# Altium footprint library UltraZOhm_CarrierBoard.PcbLib: 123 footprints (part 7 of 8)
Each footprint in its own frame and in the unit in brackets; x right, y up, seen from the top. Pads: shape width x height; smd on the part's side, far side on the other; paste and mask are expansions set on the pad; w line width, h text height; cw(c..) or ccw(c..) is an arc to the next point about the centre after c.
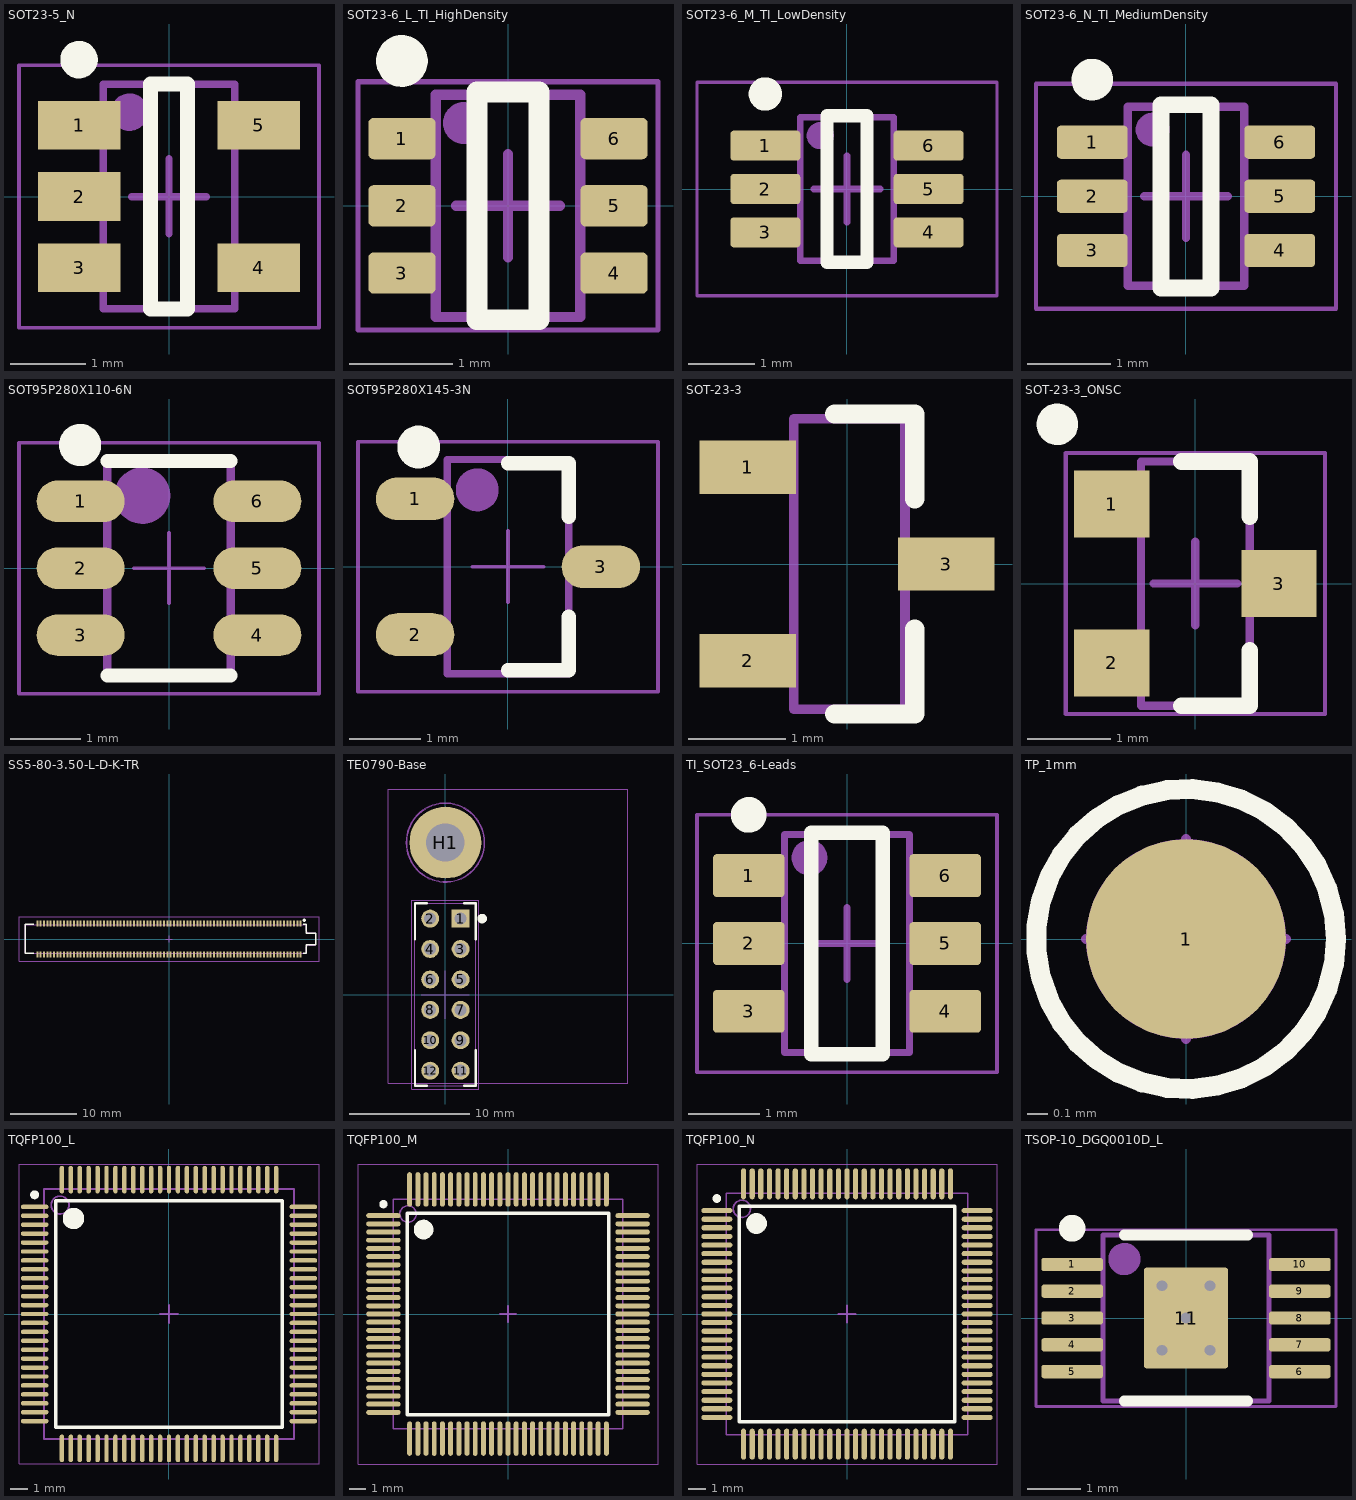
[diagram p6: the footprints below, top view; thin cyan lines are the x and y axes]

## SOT23-5_N [mm] "SOT23, 5-Leads, Body 2.9x1.6mm, Pitch 0.95mm, Lead Span 2.8mm, IPC Medium Density"
height 1.45
pads (5):
  rect 1.1x0.65 smd: 1(-1.2,0.95) 2(-1.2,0) 3(-1.2,-0.95) 4(1.2,-0.95) 5(1.2,0.95)
Top Overlay:
  circle w0.25: c-1.2,1.825 r0.125
  lines w0.2: -0.25,-1.5 0.25,-1.5 0.25,1.5 -0.25,1.5 -0.25,-1.5
M5 Assembly Top:
  circle w0.25: c-0.525,1.125 r0.125
  lines w0.05: -0.85,-1.15 -1.5,-1.15 -1.5,-0.75 -0.85,-0.75 ; -0.85,-0.2 -1.5,-0.2 -1.5,0.2 -0.85,0.2 ; -0.85,0.75 -1.5,0.75 -1.5,1.15 -0.85,1.15 ; 0.85,-1.15 1.5,-1.15 1.5,-0.75 0.85,-0.75 ; 0.85,0.75 1.5,0.75 1.5,1.15 0.85,1.15
  lines w0.1: -0.875,-1.5 -0.875,1.5 0.875,1.5 0.875,-1.5 -0.875,-1.5
  text ".Designator" at 0.4,-1.324 h0.76
Mechanical 15:
  lines w0.05: -2,-1.75 -2,1.75 2,1.75 2,-1.75 -2,-1.75
  lines w0.1: -0.5,0 0.5,0 ; 0,-0.5 0,0.5
3D body: height 1.45, standoff 0, extent -0.875,-1.5 0.875,1.5

## SOT23-6_L_TI_HighDensity [mm] "SOT23, 6-Leads, Body 2.15x1.4mm, Pitch 0.65mm, IPC High Density"
height 1.1
pads (6):
  rrect25% 0.65x0.4 smd: 1(-1.025,0.65) 2(-1.025,0) 3(-1.025,-0.65) 4(1.025,-0.65) 5(1.025,0) 6(1.025,0.65)
Top Overlay:
  circle w0.25: c-1.025,1.4 r0.125
  lines w0.2: -0.3,-1.1 0.3,-1.1 0.3,1.1 -0.3,1.1 -0.3,-1.1
M5 Assembly Top:
  circle w0.203: c-0.425,0.8 r0.102
  lines w0.1: -0.7,-1.075 -0.7,1.075 0.7,1.075 0.7,-1.075 -0.7,-1.075
  text ".Designator" at 0.4,-0.824 h0.76
Mechanical 15:
  lines w0.05: -1.45,-1.2 -1.45,1.2 1.45,1.2 1.45,-1.2 -1.45,-1.2
  lines w0.1: -0.5,0 0.5,0 ; 0,-0.5 0,0.5
3D body "DCK0006AakaMAA06.stp": height 0.94, standoff -0.01, extent -1.14,-1 1.14,1

## SOT23-6_M_TI_LowDensity [mm] "SOT23, 6-Leads, Body 2.15x1.4mm, Pitch 0.65mm, IPC Low Density"
height 1.1
pads (6):
  rrect22% 1.05x0.45 smd: 1(-1.225,0.65) 2(-1.225,0) 3(-1.225,-0.65) 4(1.225,-0.65) 5(1.225,0) 6(1.225,0.65)
Top Overlay:
  circle w0.25: c-1.225,1.425 r0.125
  lines w0.2: -0.3,-1.1 -0.3,1.1 0.3,1.1 0.3,-1.1 -0.3,-1.1
M5 Assembly Top:
  circle w0.203: c-0.402,0.8 r0.102
  lines w0.1: -0.7,-1.075 0.7,-1.075 0.7,1.075 -0.7,1.075 -0.7,-1.075
  text ".Designator" at 0.4,-0.924 h0.76
Mechanical 15:
  lines w0.05: -2.25,-1.6 2.25,-1.6 2.25,1.6 -2.25,1.6 -2.25,-1.6
  lines w0.1: -0.5,0 0.5,0 ; 0,-0.5 0,0.5
3D body "DCK0006AakaMAA06.stp": height 0.94, standoff -0.01, extent -1.14,-1 1.14,1

## SOT23-6_N_TI_MediumDensity [mm] "SOT23, 6-Leads, Body 2.15x1.4mm, Pitch 0.65mm, IPC Medium Density"
height 1.1
pads (6):
  rrect25% 0.85x0.4 smd: 1(-1.125,0.65) 2(-1.125,0) 3(-1.125,-0.65) 4(1.125,-0.65) 5(1.125,0) 6(1.125,0.65)
Top Overlay:
  circle w0.25: c-1.125,1.4 r0.125
  lines w0.2: -0.3,-1.1 0.3,-1.1 0.3,1.1 -0.3,1.1 -0.3,-1.1
M5 Assembly Top:
  circle w0.203: c-0.402,0.8 r0.102
  lines w0.1: -0.7,-1.075 -0.7,1.075 0.7,1.075 0.7,-1.075 -0.7,-1.075
  text ".Designator" at 0.4,-0.924 h0.76
Mechanical 15:
  lines w0.05: -1.8,-1.35 -1.8,1.35 1.8,1.35 1.8,-1.35 -1.8,-1.35
  lines w0.1: -0.5,0 0.5,0 ; 0,-0.5 0,0.5
3D body "DCK0006AakaMAA06.stp": height 0.94, standoff -0.01, extent -1.14,-1 1.14,1

## SOT95P280X110-6N [mm]
height 1.1
pads (6):
  oval 1.25x0.59 smd: 1(-1.255,0.95) 2(-1.255,0) 3(-1.255,-0.95) 4(1.255,-0.95) 5(1.255,0) 6(1.255,0.95)
Top Overlay:
  circle w0.3: c-1.262,1.75 r0.15
  lines w0.2: -0.875,-1.525 0.874,-1.525 ; -0.874,1.525 0.875,1.525
M5 Assembly Top:
  circle w0.4: c-0.38,1.03 r0.2
  lines w0.12: -0.88,-1.53 0.88,-1.53 0.88,1.53 -0.88,1.53 -0.88,-1.53
  text ".Designator" at 0.5,-1.324 h0.76
Mechanical 15:
  lines w0.05: -0.5,0 0.5,0 ; 0,-0.5 0,0.5 ; -2.13,-1.78 2.13,-1.78 2.13,1.78 -2.13,1.78 -2.13,-1.78
3D body "User Library-TSOT-23-6(S6).STEP": height 1, standoff 0, extent -1.412,-1.45 1.412,1.45

## SOT95P280X145-3N [mm] "SOT23, 3-Leads, Body 3,0x3,0mm (max), Pitch 0,95mm, IPC Medium Density"
height 1.45
pads (3):
  oval 1.1x0.6 smd: 1(-1.3,0.95) 2(-1.3,-0.95) 3(1.3,0)
Top Overlay:
  circle w0.3: c-1.25,1.675 r0.15
  lines w0.2: 0,-1.45 0.85,-1.45 0.85,-0.7 ; 0,1.45 0.85,1.45 0.85,0.7
M5 Assembly Top:
  circle w0.3: c-0.43,1.075 r0.15
  lines w0.05: -0.85,-1.15 -1.675,-1.15 -1.675,-0.75 -0.85,-0.75 ; -0.85,0.75 -1.675,0.75 -1.675,1.15 -0.85,1.15 ; 0.85,-0.2 1.675,-0.2 1.675,0.2 0.85,0.2
  lines w0.1: -0.85,-1.5 -0.85,1.5 0.85,1.5 0.85,-1.5 -0.85,-1.5
  text ".Designator" at 0.4,-1.224 h0.76
Mechanical 15:
  lines w0.05: -0.5,0 0.5,0 ; 0,-0.5 0,0.5 ; -2.1,-1.75 -2.1,1.75 2.1,1.75 2.1,-1.75 -2.1,-1.75
3D body "SW3dPS-3-lead sot23-3.STEP": height 1.01, standoff -0.01, extent -1.25,-1.46 1.226,1.46

## SOT-23-3 [mm] "3-pin SOT-23"
height 1.1
pads (3):
  rect 1x0.55 smd: 1(-1.025,1) 2(-1.025,-1) 3(1.025,0)
Top Overlay:
  lines w0.2: -0.125,-1.55 0.7,-1.55 0.7,-0.675 ; -0.125,1.55 0.7,1.55 0.7,0.675
M5 Assembly Top:
  lines w0.05: -0.55,-1.2 -1.375,-1.2 -1.375,-0.8 -0.55,-0.8 ; -0.55,0.8 -1.375,0.8 -1.375,1.2 -0.55,1.2 ; 0.6,-0.2 1.375,-0.2 1.375,0.2 0.6,0.2
  lines w0.1: -0.55,-1.5 0.6,-1.5 0.6,1.5 -0.55,1.5 -0.55,-1.5
  text ".Designator" at 0.4,-1.224 h0.76
3D body "User Library-SOT-23-3-1.STEP": height 1.1, standoff 0, extent -1.247,-1.5 1.295,1.5

## SOT-23-3_ONSC [mm] "SOT23, 3-Leads, Body 2.92x1.3mm, Pitch 0.95mm"
height 1.11
pads (3):
  rect 0.9x0.8 smd: 1(-1,0.95) 2(-1,-0.95) 3(1,0)
Top Overlay:
  circle w0.25: c-1.651,1.905 r0.123
  lines w0.2: -0.165,-1.46 0.65,-1.46 0.65,-0.8 ; -0.165,1.46 0.65,1.46 0.65,0.8
M5 Assembly Top:
  lines w0.05: -0.65,-1.2 -1.3,-1.2 -1.3,-0.8 -0.65,-0.8 ; -0.65,0.8 -1.3,0.8 -1.3,1.2 -0.65,1.2 ; 0.65,-0.2 1.3,-0.2 1.3,0.2 0.65,0.2
  lines w0.1: -0.65,-1.46 0.65,-1.46 0.65,1.46 -0.65,1.46 -0.65,-1.46
  text ".Designator" at 0.4,-1.224 h0.76
Mechanical 15:
  lines w0.05: -1.55,-1.56 1.55,-1.56 1.55,1.56 -1.55,1.56 -1.55,-1.56
  lines w0.1: -0.5,0 0.5,0 ; 0,-0.5 0,0.5
3D body: height 1.11, standoff 0.01, extent -0.65,-1.46 0.65,1.46

## SS5-80-3.50-L-D-K-TR [mm]
height 3.5
pads (160):
  rrect20% 0.3x0.93 smd mask+0.05: 1(19.75,2.335) 2(19.75,-2.335) 3(19.25,2.335) 4(19.25,-2.335) 5(18.75,2.335) 6(18.75,-2.335) 7(18.25,2.335) 8(18.25,-2.335) 9(17.75,2.335) 10(17.75,-2.335) 11(17.25,2.335) 12(17.25,-2.335) 13(16.75,2.335) 14(16.75,-2.335) 15(16.25,2.335) 16(16.25,-2.335) 17(15.75,2.335) 18(15.75,-2.335) 19(15.25,2.335) 20(15.25,-2.335) 21(14.75,2.335) 22(14.75,-2.335) 23(14.25,2.335) 24(14.25,-2.335) 25(13.75,2.335) 26(13.75,-2.335) 27(13.25,2.335) 28(13.25,-2.335) 29(12.75,2.335) 30(12.75,-2.335) 31(12.25,2.335) 32(12.25,-2.335) 33(11.75,2.335) 34(11.75,-2.335) 35(11.25,2.335) 36(11.25,-2.335) 37(10.75,2.335) 38(10.75,-2.335) 39(10.25,2.335) 40(10.25,-2.335) 41(9.75,2.335) 42(9.75,-2.335) 43(9.25,2.335) 44(9.25,-2.335) 45(8.75,2.335) 46(8.75,-2.335) 47(8.25,2.335) 48(8.25,-2.335) 49(7.75,2.335) 50(7.75,-2.335) 51(7.25,2.335) 52(7.25,-2.335) 53(6.75,2.335) 54(6.75,-2.335) 55(6.25,2.335) 56(6.25,-2.335) 57(5.75,2.335) 58(5.75,-2.335) 59(5.25,2.335) 60(5.25,-2.335) 61(4.75,2.335) 62(4.75,-2.335) 63(4.25,2.335) 64(4.25,-2.335) 65(3.75,2.335) 66(3.75,-2.335) 67(3.25,2.335) 68(3.25,-2.335) 69(2.75,2.335) 70(2.75,-2.335) 71(2.25,2.335) 72(2.25,-2.335) 73(1.75,2.335) 74(1.75,-2.335) 75(1.25,2.335) 76(1.25,-2.335) 77(0.75,2.335) 78(0.75,-2.335) 79(0.25,2.335) 80(0.25,-2.335) 81(-0.25,2.335) 82(-0.25,-2.335) 83(-0.75,2.335) 84(-0.75,-2.335) 85(-1.25,2.335) 86(-1.25,-2.335) 87(-1.75,2.335) 88(-1.75,-2.335) 89(-2.25,2.335) 90(-2.25,-2.335) 91(-2.75,2.335) 92(-2.75,-2.335) 93(-3.25,2.335) 94(-3.25,-2.335) 95(-3.75,2.335) 96(-3.75,-2.335) 97(-4.25,2.335) 98(-4.25,-2.335) 99(-4.75,2.335) 100(-4.75,-2.335) 101(-5.25,2.335) 102(-5.25,-2.335) 103(-5.75,2.335) 104(-5.75,-2.335) 105(-6.25,2.335) 106(-6.25,-2.335) 107(-6.75,2.335) 108(-6.75,-2.335) 109(-7.25,2.335) 110(-7.25,-2.335) 111(-7.75,2.335) 112(-7.75,-2.335) 113(-8.25,2.335) 114(-8.25,-2.335) 115(-8.75,2.335) 116(-8.75,-2.335) 117(-9.25,2.335) 118(-9.25,-2.335) 119(-9.75,2.335) 120(-9.75,-2.335) 121(-10.25,2.335) 122(-10.25,-2.335) 123(-10.75,2.335) 124(-10.75,-2.335) 125(-11.25,2.335) 126(-11.25,-2.335) 127(-11.75,2.335) 128(-11.75,-2.335) 129(-12.25,2.335) 130(-12.25,-2.335) 131(-12.75,2.335) 132(-12.75,-2.335) 133(-13.25,2.335) 134(-13.25,-2.335) 135(-13.75,2.335) 136(-13.75,-2.335) 137(-14.25,2.335) 138(-14.25,-2.335) 139(-14.75,2.335) 140(-14.75,-2.335) 141(-15.25,2.335) 142(-15.25,-2.335) 143(-15.75,2.335) 144(-15.75,-2.335) 145(-16.25,2.335) 146(-16.25,-2.335) 147(-16.75,2.335) 148(-16.75,-2.335) 149(-17.25,2.335) 150(-17.25,-2.335) 151(-17.75,2.335) 152(-17.75,-2.335) 153(-18.25,2.335) 154(-18.25,-2.335) 155(-18.75,2.335) 156(-18.75,-2.335) 157(-19.25,2.335) 158(-19.25,-2.335) 159(-19.75,2.335) 160(-19.75,-2.335)
Top Overlay:
  circle w0.25: c20.3,2.81 r0.125
  lines w0.2: -20.3,-2.175 -21.571,-2.175 -21.571,2.175 -20.3,2.175 ; 20.15,-2.175 20.58,-2.175 20.58,-0.9 21.98,-0.9 21.98,0.9 20.58,0.9 20.58,2.175 20.15,2.175
M5 Assembly Top:
  lines w0.1: -21.56,-2.175 -21.56,2.175 20.58,2.175 20.58,1.3 ccw(c20.98,1.3) 20.98,0.9 21.83,0.9 cw(c21.83,0.75) 21.98,0.75 21.98,-0.75 cw(c21.83,-0.75) 21.83,-0.9 20.98,-0.9 ccw(c20.98,-1.3) 20.58,-1.3 20.58,-2.175 -21.56,-2.175
  text "160" at -21.105,-1.853 h0.6
  text "159" at -21.105,0.772 h0.6
  text "2" at 19.595,-1.878 h0.6
  text "1" at 19.745,0.847 h0.6
  text ".Designator" at -2.005,-0.503 h1.52
Mechanical 15:
  lines w0.05: -0.5,0 0.5,0 ; 0,-0.5 0,0.5 ; -22.5,-3.3 -22.5,3.3 22.5,3.3 22.5,-3.3 -22.5,-3.3
3D body "SS5-80-3.50-D-K-TR.stp": height 4.03, standoff 0.03, extent -21.56,-2.5 21.98,2.5

## TE0790-Base [mm]
height 15
pads (13):
  rect 1.5x1.5 hole 1: 1(1.27,6.35)
  round 1.5 hole 1: 2(-1.27,6.35) 3(1.27,3.81) 4(-1.27,3.81) 5(1.27,1.27) 6(-1.27,1.27) 7(1.27,-1.27) 8(-1.27,-1.27) 9(1.27,-3.81) 10(-1.27,-3.81) 11(1.27,-6.35) 12(-1.27,-6.35)
  round 6 hole 3.2: H1(0,12.7)
Top Overlay:
  circle w0.4: c3.07,6.35 r0.2
  lines w0.2: -2.54,-4.62 -2.54,-7.62 -1.56,-7.62 ; -2.54,4.62 -2.54,7.62 -1.56,7.62 ; 1.56,-7.62 2.54,-7.62 2.54,-4.62 ; 1.56,7.62 2.54,7.62 2.54,4.62
M5 Assembly Top:
  circle w0.1: c0,12.7 r1.6
  circle w0.1: c0,12.7 r3.25
  lines w0.1: -2.54,-7.62 2.54,-7.62 2.54,7.62 -2.54,7.62 -2.54,-7.62
  text "11" at 1,-5.23 h1
  text "12" at -2,-5.23 h1
  text "2" at -2,6.73 h1
  text "1" at 1,6.73 h1
  text ".Designator" at -4.75,-2.35 h1.52
Mechanical 11:
  lines w0.1: -4.78,-7.38 15.24,-7.38 15.24,17.174 -4.78,17.174 -4.78,-7.38
Mechanical 14:
  circle w0.1: c0,12.7 r3.25
  circle w0.1: c0,12.7 r1.6
Mechanical 15:
  circle w0.05: c0,12.7 r3.3
  lines w0.05: -2,0 2,0 ; -1,12.7 1,12.7 ; 0,-2 0,2 ; 0,11.7 0,13.7 ; -2.8,-7.88 2.8,-7.88 2.8,7.88 -2.8,7.88 -2.8,-7.88
Mechanical 16:
  circle w0.05: c0,12.7 r3.3
3D body "female_header_a-bl254-dg-g12d.stp": height 8.5, standoff -3.2, extent -2.5,-7.745 2.5,7.745
3D body "TE0790-01.step": height 14.23, standoff 2.57, extent -4.78,-7.62 15.24,18.697

## TI_SOT23_6-Leads [mm] "SOT23, 6-Leads, Body 3.05x1.75mm, Pitch 0.95mm, IPC Medium Density"
height 1.45
pads (6):
  rrect17% 1x0.6 smd: 1(-1.375,0.95) 2(-1.375,0) 3(-1.375,-0.95) 4(1.375,-0.95) 5(1.375,0) 6(1.375,0.95)
Top Overlay:
  circle w0.25: c-1.375,1.8 r0.125
  lines w0.2: -0.5,-1.55 0.5,-1.55 0.5,1.55 -0.5,1.55 -0.5,-1.55
M5 Assembly Top:
  circle w0.25: c-0.525,1.2 r0.125
  lines w0.1: -0.875,-1.525 -0.875,1.525 0.875,1.525 0.875,-1.525 -0.875,-1.525
  text ".Designator" at 0.4,-1.324 h0.76
Mechanical 15:
  lines w0.05: -2.1,-1.8 -2.1,1.8 2.1,1.8 2.1,-1.8 -2.1,-1.8
  lines w0.1: -0.5,0 0.5,0 ; 0,-0.5 0,0.5
3D body "DBV0006AakaMF06A.stp": height 1.11, standoff -0.01, extent -1.422,-1.461 1.422,1.46

## TP_1mm [mm]
pads (1):
  round 1 smd paste-1: 1(0,0)
Top Overlay:
  circle w0.1: c0,0 r0.75
M5 Assembly Top:
  circle w0.6: c0,0 r0.2
Mechanical 15:
  circle w0.05: c0,0 r0.75
  lines w0.05: -0.5,0 0.5,0 ; 0,-0.5 0,0.5

## TQFP100_L [mm] "Thin QFP, 100-Leads, Body 14x14mm, Pitch 0.5mm, IPC High Density"
height 1.6
pads (100):
  oval 1.55x0.25 smd: 1(-7.525,6) 2(-7.525,5.5) 3(-7.525,5) 4(-7.525,4.5) 5(-7.525,4) 6(-7.525,3.5) 7(-7.525,3) 8(-7.525,2.5) 9(-7.525,2) 10(-7.525,1.5) 11(-7.525,1) 12(-7.525,0.5) 13(-7.525,0) 14(-7.525,-0.5) 15(-7.525,-1) 16(-7.525,-1.5) 17(-7.525,-2) 18(-7.525,-2.5) 19(-7.525,-3) 20(-7.525,-3.5) 21(-7.525,-4) 22(-7.525,-4.5) 23(-7.525,-5) 24(-7.525,-5.5) 25(-7.525,-6) 51(7.525,-6) 52(7.525,-5.5) 53(7.525,-5) 54(7.525,-4.5) 55(7.525,-4) 56(7.525,-3.5) 57(7.525,-3) 58(7.525,-2.5) 59(7.525,-2) 60(7.525,-1.5) 61(7.525,-1) 62(7.525,-0.5) 63(7.525,0) 64(7.525,0.5) 65(7.525,1) 66(7.525,1.5) 67(7.525,2) 68(7.525,2.5) 69(7.525,3) 70(7.525,3.5) 71(7.525,4) 72(7.525,4.5) 73(7.525,5) 74(7.525,5.5) 75(7.525,6)
  oval 0.25x1.55 smd: 26(-6,-7.525) 27(-5.5,-7.525) 28(-5,-7.525) 29(-4.5,-7.525) 30(-4,-7.525) 31(-3.5,-7.525) 32(-3,-7.525) 33(-2.5,-7.525) 34(-2,-7.525) 35(-1.5,-7.525) 36(-1,-7.525) 37(-0.5,-7.525) 38(0,-7.525) 39(0.5,-7.525) 40(1,-7.525) 41(1.5,-7.525) 42(2,-7.525) 43(2.5,-7.525) 44(3,-7.525) 45(3.5,-7.525) 46(4,-7.525) 47(4.5,-7.525) 48(5,-7.525) 49(5.5,-7.525) 50(6,-7.525) 76(6,7.525) 77(5.5,7.525) 78(5,7.525) 79(4.5,7.525) 80(4,7.525) 81(3.5,7.525) 82(3,7.525) 83(2.5,7.525) 84(2,7.525) 85(1.5,7.525) 86(1,7.525) 87(0.5,7.525) 88(0,7.525) 89(-0.5,7.525) 90(-1,7.525) 91(-1.5,7.525) 92(-2,7.525) 93(-2.5,7.525) 94(-3,7.525) 95(-3.5,7.525) 96(-4,7.525) 97(-4.5,7.525) 98(-5,7.525) 99(-5.5,7.525) 100(-6,7.525)
Top Overlay:
  circle w0.6: c-5.35,5.35 r0.3
  circle w0.25: c-7.525,6.675 r0.125
  lines w0.2: -6.35,-6.35 6.35,-6.35 6.35,6.35 -6.35,6.35 -6.35,-6.35
M5 Assembly Top:
  circle w0.1: c-6.1,6.1 r0.5
  lines w0.1: -7,-7 7,-7 7,7 -7,7 -7,-7
  text ".Designator" at -1.724,-0.8 h1.52
Mechanical 15:
  lines w0.05: -8.4,-8.4 8.4,-8.4 8.4,8.4 -8.4,8.4 -8.4,-8.4
  lines w0.1: -0.5,0 0.5,0 ; 0,-0.5 0,0.5
3D body: height 1.6, standoff 0, extent -7,-7 7,7

## TQFP100_M [mm] "Thin QFP, 100-Leads, Body 14x14mm, Pitch 0.5mm, IPC Low Density"
height 1.6
pads (100):
  oval 2.1x0.3 smd: 1(-7.6,6) 2(-7.6,5.5) 3(-7.6,5) 4(-7.6,4.5) 5(-7.6,4) 6(-7.6,3.5) 7(-7.6,3) 8(-7.6,2.5) 9(-7.6,2) 10(-7.6,1.5) 11(-7.6,1) 12(-7.6,0.5) 13(-7.6,0) 14(-7.6,-0.5) 15(-7.6,-1) 16(-7.6,-1.5) 17(-7.6,-2) 18(-7.6,-2.5) 19(-7.6,-3) 20(-7.6,-3.5) 21(-7.6,-4) 22(-7.6,-4.5) 23(-7.6,-5) 24(-7.6,-5.5) 25(-7.6,-6) 51(7.6,-6) 52(7.6,-5.5) 53(7.6,-5) 54(7.6,-4.5) 55(7.6,-4) 56(7.6,-3.5) 57(7.6,-3) 58(7.6,-2.5) 59(7.6,-2) 60(7.6,-1.5) 61(7.6,-1) 62(7.6,-0.5) 63(7.6,0) 64(7.6,0.5) 65(7.6,1) 66(7.6,1.5) 67(7.6,2) 68(7.6,2.5) 69(7.6,3) 70(7.6,3.5) 71(7.6,4) 72(7.6,4.5) 73(7.6,5) 74(7.6,5.5) 75(7.6,6)
  oval 0.3x2.1 smd: 26(-6,-7.6) 27(-5.5,-7.6) 28(-5,-7.6) 29(-4.5,-7.6) 30(-4,-7.6) 31(-3.5,-7.6) 32(-3,-7.6) 33(-2.5,-7.6) 34(-2,-7.6) 35(-1.5,-7.6) 36(-1,-7.6) 37(-0.5,-7.6) 38(0,-7.6) 39(0.5,-7.6) 40(1,-7.6) 41(1.5,-7.6) 42(2,-7.6) 43(2.5,-7.6) 44(3,-7.6) 45(3.5,-7.6) 46(4,-7.6) 47(4.5,-7.6) 48(5,-7.6) 49(5.5,-7.6) 50(6,-7.6) 76(6,7.6) 77(5.5,7.6) 78(5,7.6) 79(4.5,7.6) 80(4,7.6) 81(3.5,7.6) 82(3,7.6) 83(2.5,7.6) 84(2,7.6) 85(1.5,7.6) 86(1,7.6) 87(0.5,7.6) 88(0,7.6) 89(-0.5,7.6) 90(-1,7.6) 91(-1.5,7.6) 92(-2,7.6) 93(-2.5,7.6) 94(-3,7.6) 95(-3.5,7.6) 96(-4,7.6) 97(-4.5,7.6) 98(-5,7.6) 99(-5.5,7.6) 100(-6,7.6)
Top Overlay:
  circle w0.25: c-7.6,6.7 r0.125
  circle w0.6: c-5.15,5.15 r0.3
  lines w0.2: -6.15,-6.15 -6.15,6.15 6.15,6.15 6.15,-6.15 -6.15,-6.15
M5 Assembly Top:
  circle w0.1: c-6.1,6.1 r0.5
  lines w0.1: -7,-7 -7,7 7,7 7,-7 -7,-7
  text ".Designator" at -1.824,-0.8 h1.52
Mechanical 15:
  lines w0.05: -9.15,-9.15 -9.15,9.15 9.15,9.15 9.15,-9.15 -9.15,-9.15
  lines w0.1: -0.5,0 0.5,0 ; 0,-0.5 0,0.5
3D body: height 1.6, standoff 0, extent -7,-7 7,7

## TQFP100_N [mm] "Thin QFP, 100-Leads, Body 14x14mm, Pitch 0.5mm, IPC Medium Density"
height 1.6
pads (100):
  oval 1.8x0.3 smd: 1(-7.55,6) 2(-7.55,5.5) 3(-7.55,5) 4(-7.55,4.5) 5(-7.55,4) 6(-7.55,3.5) 7(-7.55,3) 8(-7.55,2.5) 9(-7.55,2) 10(-7.55,1.5) 11(-7.55,1) 12(-7.55,0.5) 13(-7.55,0) 14(-7.55,-0.5) 15(-7.55,-1) 16(-7.55,-1.5) 17(-7.55,-2) 18(-7.55,-2.5) 19(-7.55,-3) 20(-7.55,-3.5) 21(-7.55,-4) 22(-7.55,-4.5) 23(-7.55,-5) 24(-7.55,-5.5) 25(-7.55,-6) 51(7.55,-6) 52(7.55,-5.5) 53(7.55,-5) 54(7.55,-4.5) 55(7.55,-4) 56(7.55,-3.5) 57(7.55,-3) 58(7.55,-2.5) 59(7.55,-2) 60(7.55,-1.5) 61(7.55,-1) 62(7.55,-0.5) 63(7.55,0) 64(7.55,0.5) 65(7.55,1) 66(7.55,1.5) 67(7.55,2) 68(7.55,2.5) 69(7.55,3) 70(7.55,3.5) 71(7.55,4) 72(7.55,4.5) 73(7.55,5) 74(7.55,5.5) 75(7.55,6)
  oval 0.3x1.8 smd: 26(-6,-7.55) 27(-5.5,-7.55) 28(-5,-7.55) 29(-4.5,-7.55) 30(-4,-7.55) 31(-3.5,-7.55) 32(-3,-7.55) 33(-2.5,-7.55) 34(-2,-7.55) 35(-1.5,-7.55) 36(-1,-7.55) 37(-0.5,-7.55) 38(0,-7.55) 39(0.5,-7.55) 40(1,-7.55) 41(1.5,-7.55) 42(2,-7.55) 43(2.5,-7.55) 44(3,-7.55) 45(3.5,-7.55) 46(4,-7.55) 47(4.5,-7.55) 48(5,-7.55) 49(5.5,-7.55) 50(6,-7.55) 76(6,7.55) 77(5.5,7.55) 78(5,7.55) 79(4.5,7.55) 80(4,7.55) 81(3.5,7.55) 82(3,7.55) 83(2.5,7.55) 84(2,7.55) 85(1.5,7.55) 86(1,7.55) 87(0.5,7.55) 88(0,7.55) 89(-0.5,7.55) 90(-1,7.55) 91(-1.5,7.55) 92(-2,7.55) 93(-2.5,7.55) 94(-3,7.55) 95(-3.5,7.55) 96(-4,7.55) 97(-4.5,7.55) 98(-5,7.55) 99(-5.5,7.55) 100(-6,7.55)
Top Overlay:
  circle w0.25: c-7.55,6.7 r0.125
  circle w0.6: c-5.25,5.25 r0.3
  lines w0.2: -6.25,-6.25 -6.25,6.25 6.25,6.25 6.25,-6.25 -6.25,-6.25
M5 Assembly Top:
  circle w0.1: c-6.1,6.1 r0.5
  lines w0.1: -7,-7 -7,7 7,7 7,-7 -7,-7
  text ".Designator" at -1.624,-0.9 h1.52
Mechanical 15:
  lines w0.05: -8.7,-8.7 -8.7,8.7 8.7,8.7 8.7,-8.7 -8.7,-8.7
  lines w0.1: -0.5,0 0.5,0 ; 0,-0.5 0,0.5
3D body: height 1.6, standoff 0, extent -7,-7 7,7

## TSOP-10_DGQ0010D_L [mm] "TSOP, 10-Leads, Body 3.1x3.1mm, Pitch 0.5mm, Thermal Pad 1.88x1.57mm, IPC High Density"
height 1.1
pads (11):
  rrect40% 1.15x0.25 smd: 1(-2.125,1) 2(-2.125,0.5) 3(-2.125,0) 4(-2.125,-0.5) 5(-2.125,-1) 6(2.125,-1) 7(2.125,-0.5) 8(2.125,0) 9(2.125,0.5) 10(2.125,1)
  rrect6% 1.57x1.88 smd: 11(0,0)
via 0,0 diameter 0.5 hole 0.2
via 0.45,0.6 diameter 0.5 hole 0.2
via 0.45,-0.6 diameter 0.5 hole 0.2
via -0.45,-0.6 diameter 0.5 hole 0.2
via -0.45,0.6 diameter 0.5 hole 0.2
Top Overlay:
  circle w0.25: c-2.125,1.675 r0.125
  lines w0.2: -1.15,-1.55 1.15,-1.55 ; -1.15,1.55 1.15,1.55
M5 Assembly Top:
  circle w0.3: c-1.15,1.1 r0.15
  lines w0.1: -1.55,-1.55 -1.55,1.55 1.55,1.55 1.55,-1.55 -1.55,-1.55
  text ".Designator" at -1.097,-0.554 h0.76
Mechanical 15:
  lines w0.05: -2.8,-1.65 -2.8,1.65 2.8,1.65 2.8,-1.65 -2.8,-1.65
  lines w0.1: -0.5,0 0.5,0 ; 0,-0.5 0,0.5
3D body "DGQ0010.stp": height 0.94, standoff -0.02, extent -2.451,-1.499 2.451,1.499